# Altium footprint library DR-WiFi Servo.PcbLib: 44 footprints (part 2 of 3)
Each footprint in its own frame and in the unit in brackets; x right, y up, seen from the top. Pads: shape width x height; smd on the part's side, far side on the other; paste and mask are expansions set on the pad; w line width, h text height; cw(c..) or ccw(c..) is an arc to the next point about the centre after c.
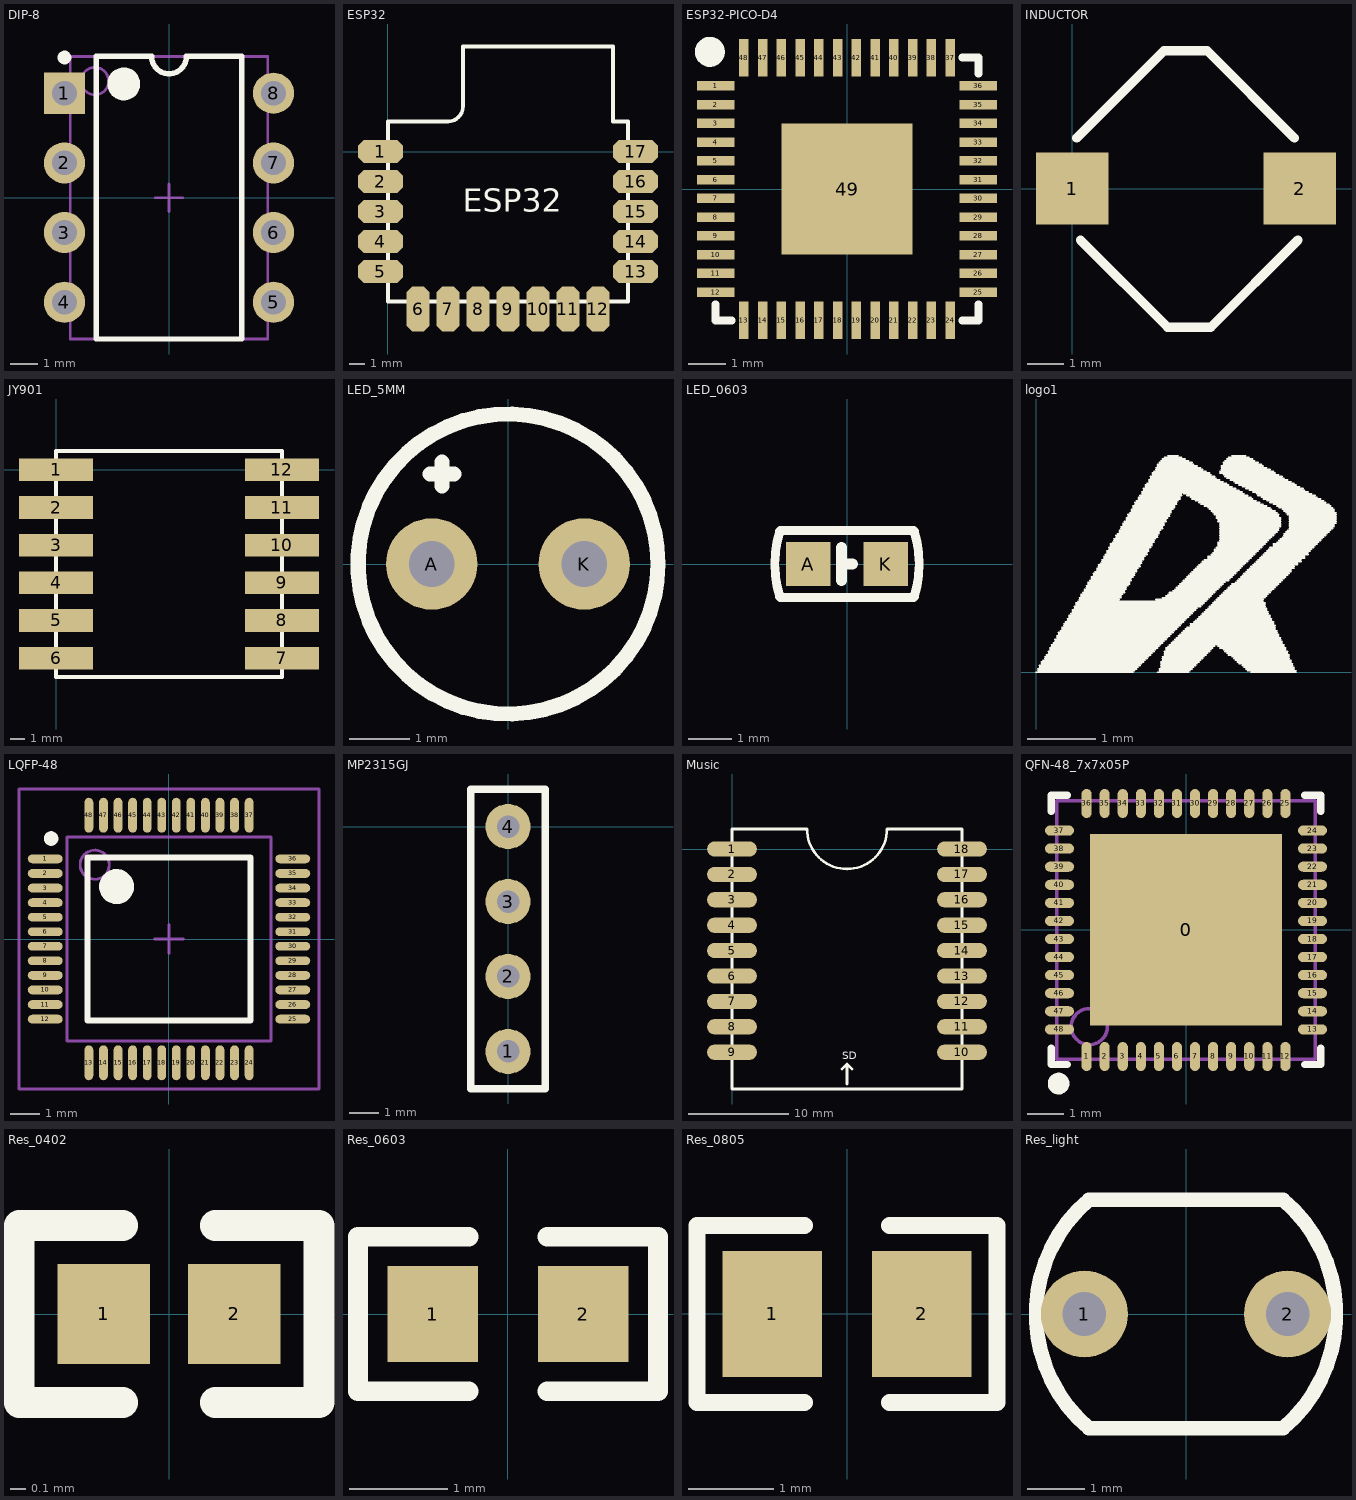
[diagram p1: the footprints below, top view; thin cyan lines are the x and y axes]

## DIP-8 [mm] "DIP; 8 Leads; Row Spacing 7.62 mm; Pitch 2.54 mm"
height 5.08
pads (8):
  rect 1.5x1.5 hole 0.9: 1(-3.81,3.81)
  round 1.5 hole 0.9: 2(-3.81,1.27) 3(-3.81,-1.27) 4(-3.81,-3.81) 5(3.81,-3.81) 6(3.81,-1.27) 7(3.81,1.27) 8(3.81,3.81)
Top Overlay:
  circle w0.6: c-1.65,4.15 r0.3
  circle w0.25: c-3.81,5.11 r0.125
  lines w0.2: -2.65,-5.15 2.65,-5.15 2.65,5.15 0.635,5.15 cw(c0,5.15) -0.635,5.15 -2.65,5.15 -2.65,-5.15
Mechanical 13:
  circle w0.1: c-2.7,4.25 r0.5
  lines w0.1: -3.6,-5.15 3.6,-5.15 3.6,5.15 -3.6,5.15 -3.6,-5.15
Mechanical 15:
  lines w0.1: -0.5,0 0.5,0 ; 0,-0.5 0,0.5
3D body: height 5.08, standoff 0, extent -3.6,-5.15 3.6,5.15

## ESP32 [mm]
pads (17):
  oct 3x1.524 smd: 1(-0.5,0) 2(-0.5,-2) 3(-0.5,-4) 4(-0.5,-6) 5(-0.5,-8) 13(16.5,-8) 14(16.5,-6) 15(16.5,-4) 16(16.5,-2) 17(16.5,0)
  oct 1.524x3 smd: 6(2,-10.5) 7(4,-10.5) 8(6,-10.5) 9(8,-10.5) 10(10,-10.5) 11(12,-10.5) 12(14,-10.5)
Top Overlay:
  lines w0.254: 0,-10 0,2 4,2 ccw(c4,3) 5,3 5,7 15,7 15,2 16,2 16,-10 0,-10
  text "ESP32" at 5,-4 h1.52
3D body: height 2.3, standoff 0, extent 0.053,-10.04 16.053,6.96

## ESP32-PICO-D4 [mm]
height 1
pads (49):
  rect 1x0.25 smd: 1(-3.5,2.75) 2(-3.5,2.25) 3(-3.5,1.75) 4(-3.5,1.25) 5(-3.5,0.75) 6(-3.5,0.25) 7(-3.5,-0.25) 8(-3.5,-0.75) 9(-3.5,-1.25) 10(-3.5,-1.75) 11(-3.5,-2.25) 12(-3.5,-2.75) 25(3.5,-2.75) 26(3.5,-2.25) 27(3.5,-1.75) 28(3.5,-1.25) 29(3.5,-0.75) 30(3.5,-0.25) 31(3.5,0.25) 32(3.5,0.75) 33(3.5,1.25) 34(3.5,1.75) 35(3.5,2.25) 36(3.5,2.75)
  rect 0.25x1 smd: 13(-2.75,-3.5) 14(-2.25,-3.5) 15(-1.75,-3.5) 16(-1.25,-3.5) 17(-0.75,-3.5) 18(-0.25,-3.5) 19(0.25,-3.5) 20(0.75,-3.5) 21(1.25,-3.5) 22(1.75,-3.5) 23(2.25,-3.5) 24(2.75,-3.5) 37(2.75,3.5) 38(2.25,3.5) 39(1.75,3.5) 40(1.25,3.5) 41(0.75,3.5) 42(0.25,3.5) 43(-0.25,3.5) 44(-0.75,3.5) 45(-1.25,3.5) 46(-1.75,3.5) 47(-2.25,3.5) 48(-2.75,3.5)
  rect 3.5x3.5 smd: 49(0,0)
Top Overlay:
  circle w0.4: c-3.658,3.658 r0.2
  lines w0.203: -3.505,-3.073 -3.505,-3.505 -3.073,-3.505 ; 3.073,-3.505 3.505,-3.505 3.505,-3.073 ; 3.073,3.505 3.505,3.505 3.505,3.073
3D body: height 1, standoff 0, extent -3.505,-3.505 3.505,3.505

## INDUCTOR [mm]
pads (2):
  rect 2x2 smd: 1(0,0) 2(6.299,0)
Top Overlay:
  lines w0.254: 0.127,1.397 2.54,3.81 3.734,3.81 6.147,1.397 ; 0.229,-1.422 2.642,-3.835 3.835,-3.835 6.248,-1.422
3D body: height 5.2, standoff 0, extent -0.325,-3.3 6.675,3.3

## JY901 [mm]
pads (12):
  rect 5x1.524 smd: 1(0,0) 2(0,-2.54) 3(0,-5.08) 4(0,-7.62) 5(0,-10.16) 6(0,-12.7) 7(15.24,-12.7) 8(15.24,-10.16) 9(15.24,-7.62) 10(15.24,-5.08) 11(15.24,-2.54) 12(15.24,0)
Top Overlay:
  lines w0.254: 0,-13.462 0,-13.97 15.24,-13.97 15.24,-13.462 ; 0,-11.938 0,-10.922 ; 0,-9.398 0,-8.382 ; 0,-6.858 0,-5.842 ; 0,-4.318 0,-3.302 ; 0,-1.778 0,-0.762 ; 0,0.762 0,1.27 15.24,1.27 15.24,0.762 ; 15.24,-11.938 15.24,-10.922 ; 15.24,-9.398 15.24,-8.382 ; 15.24,-6.858 15.24,-5.842 ; 15.24,-4.318 15.24,-3.302 ; 15.24,-1.778 15.24,-0.762

## LED_5MM [mil]
pads (2):
  round 60 hole 30: A(-50,0) K(50,0)
Top Overlay:
  circle w10: c0,0 r98.43
  lines w10: -51.18,59.06 -35.43,59.06 ; -43.31,51.18 -43.31,66.93

## LED_0603 [mil]
pads (2):
  rect 40x40 smd: A(-35,0) K(35,0)
Top Overlay:
  lines w8: -60.63,-29.24 cw(c35,0) -60.63,29.24 ; -60,-30 60,-30 ; -60,30 60,30 ; 60.63,-29.24 ccw(c-35,0) 60.63,29.24
  lines w10: -5,-15 -5,15 ; -5,0 5,0
3D body: height 23.62, standoff 0, extent -31.89,-15.75 31.89,15.75

## logo1 [mm]
height 1.7
Top Overlay:
  drawing of 330 lines, arcs and shapes, not listed

## LQFP-48 [mm]
height 1.6
pads (48):
  oval 1.2x0.3 smd: 1(-4.25,2.75) 2(-4.25,2.25) 3(-4.25,1.75) 4(-4.25,1.25) 5(-4.25,0.75) 6(-4.25,0.25) 7(-4.25,-0.25) 8(-4.25,-0.75) 9(-4.25,-1.25) 10(-4.25,-1.75) 11(-4.25,-2.25) 12(-4.25,-2.75) 25(4.25,-2.75) 26(4.25,-2.25) 27(4.25,-1.75) 28(4.25,-1.25) 29(4.25,-0.75) 30(4.25,-0.25) 31(4.25,0.25) 32(4.25,0.75) 33(4.25,1.25) 34(4.25,1.75) 35(4.25,2.25) 36(4.25,2.75)
  oval 0.3x1.2 smd: 13(-2.75,-4.25) 14(-2.25,-4.25) 15(-1.75,-4.25) 16(-1.25,-4.25) 17(-0.75,-4.25) 18(-0.25,-4.25) 19(0.25,-4.25) 20(0.75,-4.25) 21(1.25,-4.25) 22(1.75,-4.25) 23(2.25,-4.25) 24(2.75,-4.25) 37(2.75,4.25) 38(2.25,4.25) 39(1.75,4.25) 40(1.25,4.25) 41(0.75,4.25) 42(0.25,4.25) 43(-0.25,4.25) 44(-0.75,4.25) 45(-1.25,4.25) 46(-1.75,4.25) 47(-2.25,4.25) 48(-2.75,4.25)
Top Overlay:
  circle w0.25: c-4.05,3.45 r0.125
  circle w0.6: c-1.8,1.8 r0.3
  lines w0.2: -2.8,-2.8 -2.8,2.8 2.8,2.8 2.8,-2.8 -2.8,-2.8
Mechanical 13:
  circle w0.1: c-2.55,2.55 r0.5
  lines w0.1: -3.5,-3.5 3.5,-3.5 3.5,3.5 -3.5,3.5 -3.5,-3.5
Mechanical 15:
  lines w0.1: -0.5,0 0.5,0 ; 0,-0.5 0,0.5 ; -5.15,-5.15 -5.15,5.15 5.15,5.15 5.15,-5.15 -5.15,-5.15
3D body: height 1.4, standoff -0.01, extent -4.405,-4.413 4.405,4.413

## MP2315GJ [mil]
height 43.31
pads (4):
  round 60 hole 30: 1(0,-300) 2(0,-200) 3(0,-100) 4(0,0)
Top Overlay:
  lines w10: -50,-350 -50,50 50,50 50,-350 -50,-350
3D body: height 141.73, standoff 78.74, extent -59,-366 729,67

## Music [mm]
pads (18):
  oval 5x1.524 smd: 1(0,0) 2(0,-2.54) 3(0,-5.08) 4(0,-7.62) 5(0,-10.16) 6(0,-12.7) 7(0,-15.24) 8(0,-17.78) 9(0,-20.32) 10(23,-20.32) 11(23,-17.78) 12(23,-15.24) 13(23,-12.7) 14(23,-10.16) 15(23,-7.62) 16(23,-5.08) 17(23,-2.54) 18(23,0)
Top Overlay:
  lines w0.254: 0,-21.082 0,-24 23,-24 23,-21.082 ; 0,-19.558 0,-18.542 ; 0,-17.018 0,-16.002 ; 0,-14.478 0,-13.462 ; 0,-11.938 0,-10.922 ; 0,-9.398 0,-8.382 ; 0,-6.858 0,-5.842 ; 0,-4.318 0,-3.302 ; 0,-1.778 0,-0.762 ; 0,0.762 0,2 7.5,2 ccw(c11.5,2) 15.5,2 23,2 23,0.762 ; 11,-22 11.5,-21.5 ; 11.5,-23.5 11.5,-21.5 ; 12,-22 11.5,-21.5 ; 23,-19.558 23,-18.542 ; 23,-17.018 23,-16.002 ; 23,-14.478 23,-13.462 ; 23,-11.938 23,-10.922 ; 23,-9.398 23,-8.382 ; 23,-6.858 23,-5.842 ; 23,-4.318 23,-3.302 ; 23,-1.778 23,-0.762
  text "SD" at 11,-21 h0.76
3D body: height 3.2, standoff 0, extent 0,-25.468 23,2.032

## QFN-48_7x7x05P [mm]
pads (49):
  rect 5.3x5.3 smd mask+0.051: 0(0,0)
  oval 0.28x0.8 smd mask+0.051: 1(-2.75,-3.5) 2(-2.25,-3.5) 3(-1.75,-3.5) 4(-1.25,-3.5) 5(-0.75,-3.5) 6(-0.25,-3.5) 7(0.25,-3.5) 8(0.75,-3.5) 9(1.25,-3.5) 10(1.75,-3.5) 11(2.25,-3.5) 12(2.75,-3.5) 25(2.75,3.5) 26(2.25,3.5) 27(1.75,3.5) 28(1.25,3.5) 29(0.75,3.5) 30(0.25,3.5) 31(-0.25,3.5) 32(-0.75,3.5) 33(-1.25,3.5) 34(-1.75,3.5) 35(-2.25,3.5) 36(-2.75,3.5)
  oval 0.8x0.28 smd mask+0.051: 13(3.5,-2.75) 14(3.5,-2.25) 15(3.5,-1.75) 16(3.5,-1.25) 17(3.5,-0.75) 18(3.5,-0.25) 19(3.5,0.25) 20(3.5,0.75) 21(3.5,1.25) 22(3.5,1.75) 23(3.5,2.25) 24(3.5,2.75) 37(-3.5,2.75) 38(-3.5,2.25) 39(-3.5,1.75) 40(-3.5,1.25) 41(-3.5,0.75) 42(-3.5,0.25) 43(-3.5,-0.25) 44(-3.5,-0.75) 45(-3.5,-1.25) 46(-3.5,-1.75) 47(-3.5,-2.25) 48(-3.5,-2.75)
Top Overlay:
  circle w0.3: c-3.525,-4.25 r0.15
  lines w0.2: -3.725,-3.275 -3.725,-3.725 -3.275,-3.725 ; -3.725,3.275 -3.725,3.725 -3.275,3.725 ; 3.275,-3.725 3.725,-3.725 3.725,-3.275 ; 3.275,3.725 3.725,3.725 3.725,3.275
Mechanical 13:
  circle w0.1: c-2.675,-2.675 r0.5
  lines w0.1: -3.575,-3.575 -3.575,3.575 3.575,3.575 3.575,-3.575 -3.575,-3.575
3D body: height 0.94, standoff 0, extent -3.5,-3.5 3.5,3.5

## Res_0402 [mm]
pads (2):
  rect 0.6x0.65 smd mask+0.051: 1(-0.425,0) 2(0.425,0)
Top Overlay:
  lines w0.2: -0.3,-0.575 -0.975,-0.575 -0.975,0.575 -0.3,0.575 ; 0.3,-0.575 0.975,-0.575 0.975,0.575 0.3,0.575
3D body: height 0.41, standoff 0, extent -0.575,-0.275 0.575,0.275

## Res_0603 [mm]
pads (2):
  rect 0.93x0.98 smd: 1(-0.77,0) 2(0.77,0)
Top Overlay:
  lines w0.2: -0.4,-0.79 -1.535,-0.79 -1.535,0.79 -0.4,0.79 ; 0.4,-0.79 1.535,-0.79 1.535,0.79 0.4,0.79
3D body: height 0.56, standoff 0, extent -0.85,-0.4 0.85,0.4

## Res_0805 [mm]
pads (2):
  rect 1.16x1.47 smd: 1(-0.875,0) 2(0.875,0)
Top Overlay:
  lines w0.2: -0.5,-1.035 -1.755,-1.035 -1.755,1.035 -0.5,1.035 ; 0.5,-1.035 1.755,-1.035 1.755,1.035 0.5,1.035
3D body: height 0.49, standoff -0.01, extent -0.997,-0.625 1.003,0.625

## Res_light [mil]
pads (2):
  round 60 hole 30: 1(-70,0) 2(70,0)
Top Overlay:
  lines w10: -66.93,-78.74 cw(c0,0) -66.93,78.74 66.93,78.74 cw(c0,0) 66.93,-78.74 -66.93,-78.74